# Altium footprint library THU VIEN PCB.PCBLib: 911 footprints (part 31 of 57)
Each footprint in its own frame and in the unit in brackets; x right, y up, seen from the top. Pads: shape width x height; smd on the part's side, far side on the other; paste and mask are expansions set on the pad; w line width, h text height; cw(c..) or ccw(c..) is an arc to the next point about the centre after c.
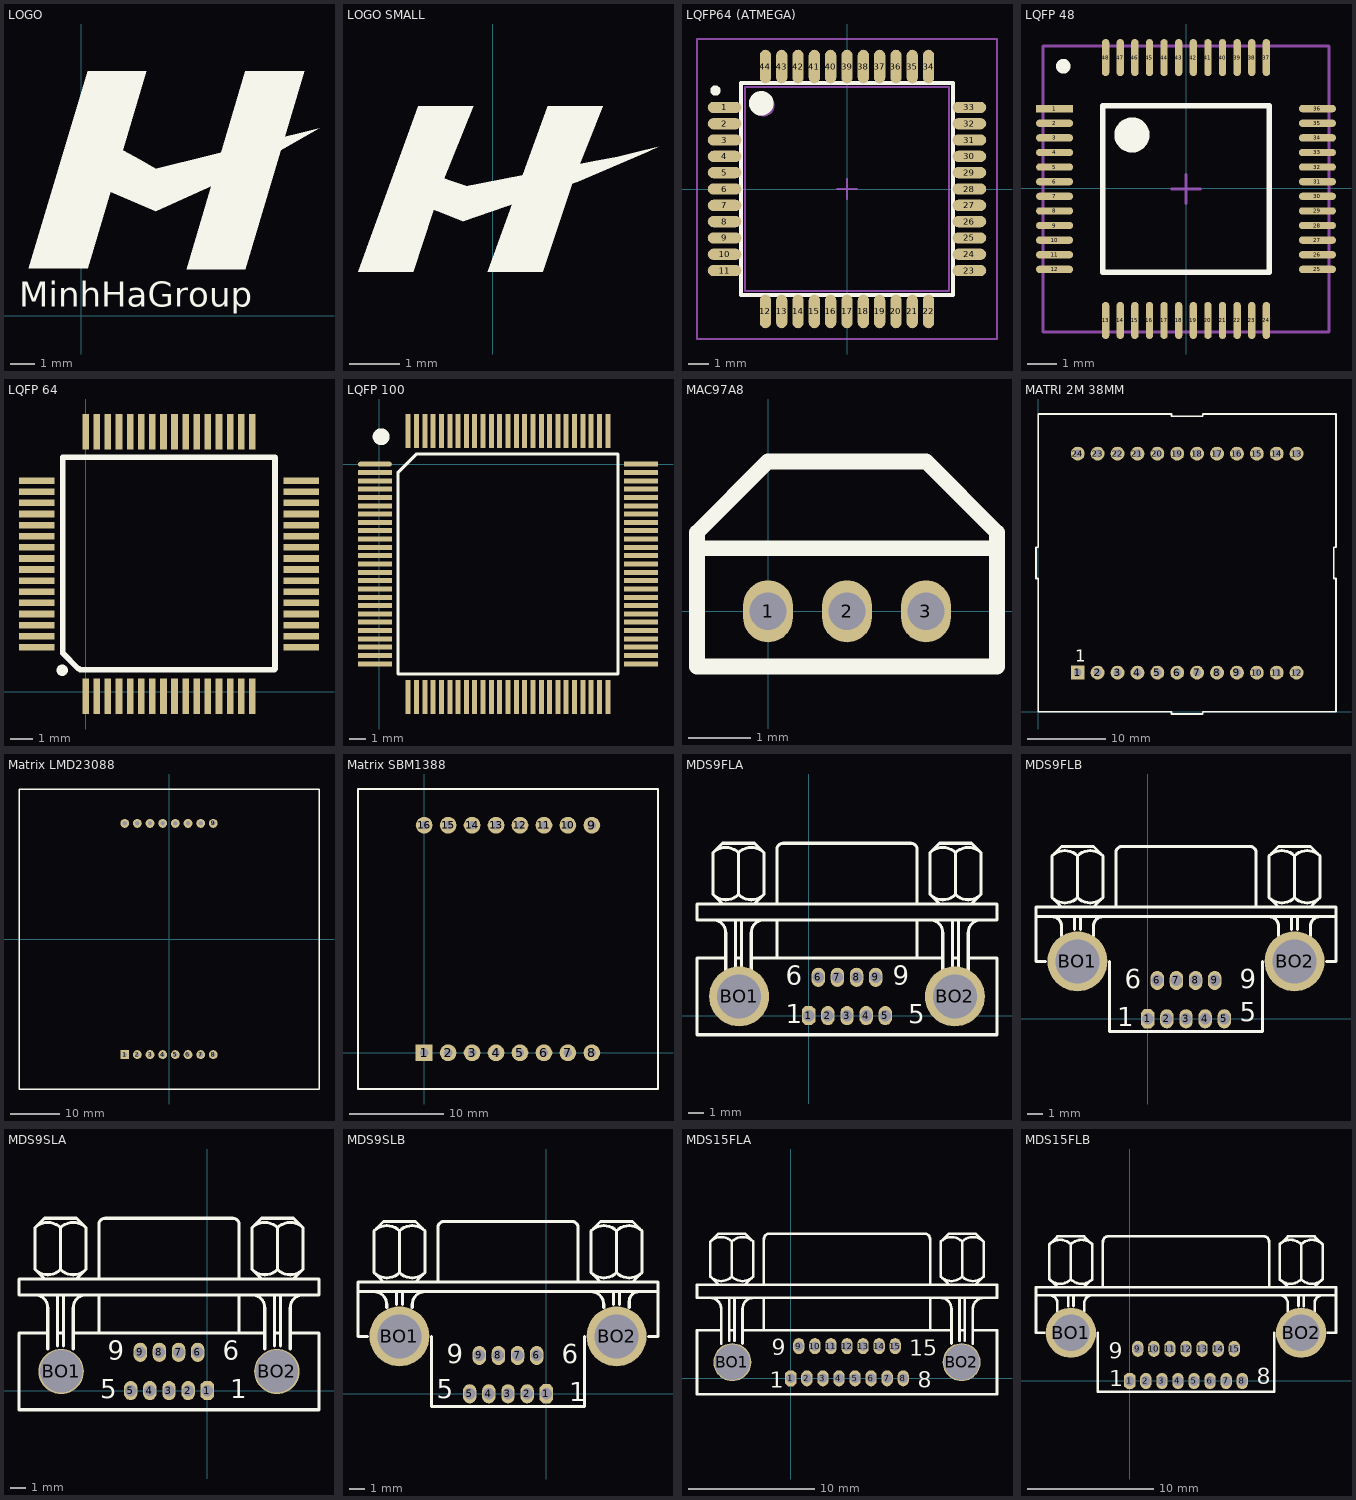
[diagram p30: the footprints below, top view; thin cyan lines are the x and y axes]

## LOGO [mil]
Top Overlay:
  region: 120,169.25 213,211.25 271,238.25 384,303 120,238
  region: 67,268 95,252 120,238 120,169 41,203 57,237
  region: 360,395 265,395 265,75
  region: 170,75 265,75 265,395
  region: -85,77 10,77 10,395
  region: 105,395 10,395 10,77
  text "MinhHaGroup" at -101,15 h40

## LOGO SMALL [mil]
Top Overlay:
  region: -3.94,102.36 39.37,102.36 43.31,232.28
  region: 86.61,232.28 43.31,232.28 39.37,102.36 62.99,173.23
  region: -15.75,232.28 -59.06,232.28 -62.99,102.36 -39.37,173.23
  region: -106.3,102.36 -62.99,102.36 -59.06,232.28
  region: -66.85,197.03 -59.31,184.17 -43.31,177.17 -13.76,167.3 -19.68,145.67 -23.62,141.73 -43.31,149.61 -78.74,161.42 -76.76,166.3
  region: -23.62,141.73 66.93,173.23 122.05,196.85 129.92,200.79 114.17,196.85 98.43,192.91 78.74,188.98 59.06,185.04 39.37,181.1 -23.62,169.29

## LQFP64 (ATMEGA) [mm] "QFP, 44-Leads, Body 10x10mm, Pitch 0.8mm, IPC High Density"
height 2.44
pads (44):
  oval 1.65x0.55 smd: 1(-6,4) 2(-6,3.2) 3(-6,2.4) 4(-6,1.6) 5(-6,0.8) 6(-6,0) 7(-6,-0.8) 8(-6,-1.6) 9(-6,-2.4) 10(-6,-3.2) 11(-6,-4) 23(6,-4) 24(6,-3.2) 25(6,-2.4) 26(6,-1.6) 27(6,-0.8) 28(6,0) 29(6,0.8) 30(6,1.6) 31(6,2.4) 32(6,3.2) 33(6,4)
  oval 0.55x1.65 smd: 12(-4,-6) 13(-3.2,-6) 14(-2.4,-6) 15(-1.6,-6) 16(-0.8,-6) 17(0,-6) 18(0.8,-6) 19(1.6,-6) 20(2.4,-6) 21(3.2,-6) 22(4,-6) 34(4,6) 35(3.2,6) 36(2.4,6) 37(1.6,6) 38(0.8,6) 39(0,6) 40(-0.8,6) 41(-1.6,6) 42(-2.4,6) 43(-3.2,6) 44(-4,6)
Top Overlay:
  circle w0.6: c-4.2,4.2 r0.3
  circle w0.25: c-6.45,4.825 r0.125
  lines w0.2: -5.2,-5.2 5.2,-5.2 5.2,5.2 -5.2,5.2 -5.2,-5.2
Mechanical 13:
  circle w0.1: c-4.1,4.1 r0.5
  lines w0.1: -5,-5 5,-5 5,5 -5,5 -5,-5
Mechanical 15:
  lines w0.1: -0.5,0 0.5,0 ; 0,-0.5 0,0.5 ; -7.35,-7.35 7.35,-7.35 7.35,7.35 -7.35,7.35 -7.35,-7.35
3D body "User Library-TQFP44.step": height 1.07, standoff 0, extent -5.994,-5.994 6.006,6.006

## LQFP 48 [mm]
pads (48):
  rect 1.27x0.25 smd: 1(-4.498,2.725)
  oval 1.27x0.25 smd: 2(-4.498,2.225) 3(-4.498,1.725) 4(-4.498,1.225) 5(-4.498,0.725) 6(-4.498,0.225) 7(-4.498,-0.275) 8(-4.498,-0.775) 9(-4.498,-1.275) 10(-4.498,-1.775) 11(-4.498,-2.275) 12(-4.498,-2.775) 25(4.498,-2.775) 26(4.498,-2.275) 27(4.498,-1.775) 28(4.498,-1.275) 29(4.498,-0.775) 30(4.498,-0.275) 31(4.498,0.225) 32(4.498,0.725) 33(4.498,1.225) 34(4.498,1.725) 35(4.498,2.225) 36(4.498,2.725)
  oval 0.25x1.27 smd: 13(-2.75,-4.524) 14(-2.25,-4.524) 15(-1.75,-4.524) 16(-1.25,-4.524) 17(-0.75,-4.524) 18(-0.25,-4.524) 19(0.25,-4.524) 20(0.75,-4.524) 21(1.25,-4.524) 22(1.75,-4.524) 23(2.25,-4.524) 24(2.75,-4.524) 37(2.75,4.473) 38(2.25,4.473) 39(1.75,4.473) 40(1.25,4.473) 41(0.75,4.473) 42(0.25,4.473) 43(-0.25,4.473) 44(-0.75,4.473) 45(-1.25,4.473) 46(-1.75,4.473) 47(-2.25,4.473) 48(-2.75,4.473)
Top Overlay:
  circle w0.25: c-4.2,4.175 r0.125
  circle w0.6: c-1.85,1.825 r0.3
  lines w0.2: -2.85,-2.875 -2.85,2.825 2.85,2.825 2.85,-2.875 -2.85,-2.875
Mechanical 15:
  lines w0.1: -0.5,-0.025 0.5,-0.025 ; 0,-0.525 0,0.475 ; -4.9,-4.925 -4.9,4.875 4.9,4.875 4.9,-4.925 -4.9,-4.925
3D body "SW3dPS-LQFP48.STEP": height 1.5, standoff 0, extent -4.5,-4.525 4.5,4.475

## LQFP 64 [mm]
pads (64):
  rect 0.3x1.6 smd: 1(0,-0.2) 2(0.5,-0.2) 3(1,-0.2) 4(1.5,-0.2) 5(2,-0.2) 6(2.5,-0.2) 7(3,-0.2) 8(3.5,-0.2) 9(4,-0.2) 10(4.5,-0.2) 11(5,-0.2) 12(5.5,-0.2) 13(6,-0.2) 14(6.5,-0.2) 15(7,-0.2) 16(7.5,-0.2) 33(7.5,11.7) 34(7,11.7) 35(6.5,11.7) 36(6,11.7) 37(5.5,11.7) 38(5,11.7) 39(4.5,11.7) 40(4,11.7) 41(3.5,11.7) 42(3,11.7) 43(2.5,11.7) 44(2,11.7) 45(1.5,11.7) 46(1,11.7) 47(0.5,11.7) 48(0,11.7)
  rect 1.6x0.3 smd: 17(9.7,2) 18(9.7,2.5) 19(9.7,3) 20(9.7,3.5) 21(9.7,4) 22(9.7,4.5) 23(9.7,5) 24(9.7,5.5) 25(9.7,6) 26(9.7,6.5) 27(9.7,7) 28(9.7,7.5) 29(9.7,8) 30(9.7,8.5) 31(9.7,9) 32(9.7,9.5) 49(-2.2,9.5) 50(-2.2,9) 51(-2.2,8.5) 52(-2.2,8) 53(-2.2,7.5) 54(-2.2,7) 55(-2.2,6.5) 56(-2.2,6) 57(-2.2,5.5) 58(-2.2,5) 59(-2.2,4.5) 60(-2.2,4) 61(-2.2,3.5) 62(-2.2,3) 63(-2.2,2.5) 64(-2.2,2)
Top Overlay:
  lines w0.254: -1.029,10.389 -1.029,10.554 8.42,10.554 8.509,10.554 8.522,10.541 8.522,1.029 8.484,0.991 -0.241,0.991 ; -1.029,10.528 -1.029,1.74 -0.318,1.029 -0.292,1.029
  lines w0.508: -1.067,0.965 -1.054,0.965
3D body "User Library-LQFP64_Grid_0_5.STEP": height 2.32, standoff -0.01, extent -2.352,-0.234 9.723,11.766

## LQFP 100 [mm]
pads (100):
  oval 2.032x0.3 smd: 1(-0.25,0)
  rect 2.032x0.3 smd: 2(-0.25,-0.5) 3(-0.25,-1) 4(-0.25,-1.5) 5(-0.25,-2) 6(-0.25,-2.5) 7(-0.25,-3) 8(-0.25,-3.5) 9(-0.25,-4) 10(-0.25,-4.5) 11(-0.25,-5) 12(-0.25,-5.5) 13(-0.25,-6) 14(-0.25,-6.5) 15(-0.25,-7) 16(-0.25,-7.5) 17(-0.25,-8) 18(-0.25,-8.5) 19(-0.25,-9) 20(-0.25,-9.5) 21(-0.25,-10) 22(-0.25,-10.5) 23(-0.25,-11) 24(-0.25,-11.5) 25(-0.25,-12) 51(15.75,-12) 52(15.75,-11.5) 53(15.75,-11) 54(15.75,-10.5) 55(15.75,-10) 56(15.75,-9.5) 57(15.75,-9) 58(15.75,-8.5) 59(15.75,-8) 60(15.75,-7.5) 61(15.75,-7) 62(15.75,-6.5) 63(15.75,-6) 64(15.75,-5.5) 65(15.75,-5) 66(15.75,-4.5) 67(15.75,-4) 68(15.75,-3.5) 69(15.75,-3) 70(15.75,-2.5) 71(15.75,-2) 72(15.75,-1.5) 73(15.75,-1) 74(15.75,-0.5) 75(15.75,0)
  rect 0.3x2.032 smd: 26(1.75,-14) 27(2.25,-14) 28(2.75,-14) 29(3.25,-14) 30(3.75,-14) 31(4.25,-14) 32(4.75,-14) 33(5.25,-14) 34(5.75,-14) 35(6.25,-14) 36(6.75,-14) 37(7.25,-14) 38(7.75,-14) 39(8.25,-14) 40(8.75,-14) 41(9.25,-14) 42(9.75,-14) 43(10.25,-14) 44(10.75,-14) 45(11.25,-14) 46(11.75,-14) 47(12.25,-14) 48(12.75,-14) 49(13.25,-14) 50(13.75,-14) 76(13.75,2) 77(13.25,2) 78(12.75,2) 79(12.25,2) 80(11.75,2) 81(11.25,2) 82(10.75,2) 83(10.25,2) 84(9.75,2) 85(9.25,2) 86(8.75,2) 87(8.25,2) 88(7.75,2) 89(7.25,2) 90(6.75,2) 91(6.25,2) 92(5.75,2) 93(5.25,2) 94(4.75,2) 95(4.25,2) 96(3.75,2) 97(3.25,2) 98(2.75,2) 99(2.25,2) 100(1.75,2)
Top Overlay:
  circle w0.508: c0.127,1.651 r0.254
  lines w0.2: 1.135,-12.615 1.135,-0.52 2.27,0.615 14.365,0.615 14.365,-12.615 1.135,-12.615
3D body "SW3dPS-LQFP100.STEP": height 1.6, standoff 0, extent -0.228,-13.994 15.772,2.006

## MAC97A8 [mm]
pads (3):
  oval 0.8x1 hole 0.6: 1(0,0) 2(1.27,0) 3(2.54,0)
Top Overlay:
  lines w0.254: -1.143,1.016 3.683,1.016 ; -1.143,1.016 -1.143,1.27 0,2.413 2.54,2.413 3.683,1.27 3.683,1.016 ; -1.143,1.016 -1.143,-0.889 3.683,-0.889 3.683,1.016

## MATRI 2M 38MM [mil]
pads (24):
  rect 70x70 hole 39.37: 1(198.08,195.94)
  round 70 hole 39.37: 2(298.08,195.94) 3(398.08,195.94) 4(498.08,195.94) 5(598.08,195.94) 6(698.08,195.94) 7(798.08,195.94) 8(898.08,195.94) 9(998.08,195.94) 10(1098.08,195.94) 11(1198.08,195.94) 12(1298.08,195.94) 13(1298.08,1296.69) 14(1198.08,1296.69) 15(1098.08,1296.69) 16(998.08,1296.69) 17(898.08,1296.69) 18(798.08,1296.69) 19(698.08,1296.69) 20(598.08,1296.69) 21(498.08,1296.69) 22(398.08,1296.69) 23(298.08,1296.69) 24(198.08,1296.69)
Top Overlay:
  lines w7.87: 0,1492.13 0,1496.06 ; -11.81,669.29 -11.81,826.77 ; -11.81,669.29 0,669.29 ; -11.81,669.29 -11.81,826.77 ; -11.81,669.29 0,669.29 ; -11.81,826.77 0,826.77 ; -11.81,826.77 0,826.77 ; 0,669.29 0,0 669.29,0 ; 0,826.77 0,1496.06 ; 0,1496.06 669.29,1496.06 ; 669.29,-11.81 669.29,0 ; 669.29,-11.81 826.77,-11.81 ; 669.29,-11.81 669.29,0 ; 669.29,-11.81 826.77,-11.81 ; 669.29,1484.25 826.77,1484.25 ; 669.29,1484.25 669.29,1496.06 ; 669.29,1484.25 669.29,1496.06 ; 669.29,1484.25 826.77,1484.25 ; 826.77,-11.81 826.77,0 ; 826.77,-11.81 826.77,0 ; 826.77,0 1496.06,0 1496.06,669.29 ; 826.77,1484.25 826.77,1496.06 ; 826.77,1484.25 826.77,1496.06 ; 826.77,1496.06 1496.06,1496.06 1496.06,1492.13 1496.06,826.77 ; 1484.25,669.29 1496.06,669.29 ; 1484.25,669.29 1484.25,826.77 ; 1484.25,669.29 1484.25,826.77 ; 1484.25,669.29 1496.06,669.29 ; 1484.25,826.77 1496.06,826.77 ; 1484.25,826.77 1496.06,826.77
  text "1" at 185.04,251.97 h60

## Matrix LMD23088 [mil] "Matrix 8x8"
pads (16):
  rect 70x70 hole 35: 1(-350,-913.39)
  round 70 hole 35: 2(-250,-913.39) 3(-150,-913.39) 4(-50,-913.39) 5(50,-913.39) 6(150,-913.39) 7(250,-913.39) 8(350,-913.39) 9(350,913.39) 10(250,913.39) 11(150,913.39) 12(50,913.39) 13(-50,913.39) 14(-150,913.39) 15(-250,913.39) 16(-350,913.39)
Top Overlay:
  lines w10: -1185.04,-1185.04 1185.04,-1185.04 1185.04,1185.04 -1185.04,1185.04 -1185.04,-1185.04

## Matrix SBM1388 [mil] "Matrix 8x8"
pads (16):
  rect 70x70 hole 35: 1(-1.1,0)
  round 70 hole 35: 2(98.9,0) 3(198.9,0) 4(298.9,0) 5(398.9,0) 6(498.9,0) 7(598.9,0) 8(698.9,0) 9(698.9,950) 10(598.9,950) 11(498.9,950) 12(398.9,950) 13(298.9,950) 14(198.9,950) 15(98.9,950) 16(-1.1,950)
Top Overlay:
  lines w10: -277.08,-150.98 -277.08,1100.98 974.88,1100.98 974.88,-150.98 -277.08,-150.98

## MDS9FLA [mil]
pads (11):
  oct 35x50 hole 30: 1(0,0)
  oval 35x50 hole 30: 2(50,0) 3(100,0) 4(150,0) 5(200,0) 6(25,100) 7(75,100) 8(125,100) 9(175,100)
  round 156.67 hole 115: BO1(-181.67,50) BO2(381.67,50)
Top Overlay:
  lines w8: -250.25,316.41 ccw(c-216.67,350) -183.08,316.41 ; -250.25,425.25 cw(c-216.67,391.67) -183.08,425.25 ; -250,250 cw(c-250,216.67) -216.67,216.67 -216.67,108.33 ; -225,291.67 -250,316.67 -250,425 -225,450 -141.67,450 -116.67,425 -116.67,316.67 -141.67,291.67 ; -216.67,150 -291.67,150 -291.67,-50 491.67,-50 491.67,150 416.67,150 ; -191.67,116.67 -191.67,250 ; -191.67,150 -175,150 ; -183.59,316.41 ccw(c-150,350) -116.41,316.41 ; -183.59,425.25 cw(c-150,391.67) -116.41,425.25 ; -183.33,316.67 -183.33,425 ; -175,116.67 -175,250 ; -150,108.33 -150,216.67 cw(c-116.67,216.67) -116.67,250 ; -150,150 350,150 ; -83.33,150 -83.33,250 ; -83.33,291.67 -83.33,433.33 cw(c-66.67,433.33) -66.67,450 266.67,450 cw(c266.67,433.33) 283.33,433.33 283.33,291.67 275,291.67 ; 283.33,150 283.33,250 ; 316.41,316.41 ccw(c350,350) 383.59,316.41 ; 316.41,425.25 cw(c350,391.67) 383.59,425.25 ; 316.67,250 cw(c316.67,216.67) 350,216.67 350,108.33 ; 341.67,291.67 316.67,316.67 316.67,425 341.67,450 425,450 450,425 450,316.67 425,291.67 ; 375,116.67 375,250 ; 375,150 391.67,150 ; 383.08,316.41 ccw(c416.67,350) 450.25,316.41 ; 383.08,425.25 cw(c416.67,391.67) 450.25,425.25 ; 383.33,316.67 383.33,425 ; 391.67,116.67 391.67,250 ; 416.67,108.33 416.67,216.67 cw(c450,216.67) 450,250 ; -291.67,250 -291.67,291.67 491.67,291.67 491.67,250 -291.67,250
  text "6" at -60,80 h50
  text "5" at 260,-20 h50
  text "9" at 220,80 h50
  text "1" at -60,-20 h50

## MDS9FLB [mil]
pads (11):
  oct 35x50 hole 30: 1(0,0)
  oval 35x50 hole 30: 2(50,0) 3(100,0) 4(150,0) 5(200,0) 6(25,100) 7(75,100) 8(125,100) 9(175,100)
  round 156.67 hole 115: BO1(-183.33,150) BO2(383.33,150)
Top Overlay:
  lines w8: -266.67,150 -291.67,150 -291.67,266.67 ; -250.25,316.41 ccw(c-216.67,350) -183.08,316.41 ; -250.25,425.25 cw(c-216.67,391.67) -183.08,425.25 ; -250,266.67 cw(c-250,241.67) -225,241.67 -225,216.67 ; -225,291.67 -250,316.67 -250,425 -225,450 -141.67,450 -116.67,425 -116.67,316.67 -141.67,291.67 ; -191.67,233.33 -191.67,266.67 ; -183.59,316.41 ccw(c-150,350) -116.41,316.41 ; -183.59,425.25 cw(c-150,391.67) -116.41,425.25 ; -183.33,316.67 -183.33,425 ; -175,233.33 -175,266.67 ; -141.67,216.67 -141.67,241.67 cw(c-116.67,241.67) -116.67,266.67 ; -100,150 -100,-33.33 300,-33.33 300,150 ; -83.33,291.67 -83.33,433.33 cw(c-66.67,433.33) -66.67,450 266.67,450 cw(c266.67,433.33) 283.33,433.33 283.33,291.67 275,291.67 ; 316.41,316.41 ccw(c350,350) 383.59,316.41 ; 316.41,425.25 cw(c350,391.67) 383.59,425.25 ; 316.67,266.67 cw(c316.67,241.67) 341.67,241.67 341.67,216.67 ; 341.67,291.67 316.67,316.67 316.67,425 341.67,450 425,450 450,425 450,316.67 425,291.67 ; 375,233.33 375,266.67 ; 383.08,316.41 ccw(c416.67,350) 450.25,316.41 ; 383.08,425.25 cw(c416.67,391.67) 450.25,425.25 ; 383.33,316.67 383.33,425 ; 391.67,233.33 391.67,266.67 ; 425,216.67 425,241.67 cw(c450,241.67) 450,266.67 ; 466.67,150 491.67,150 491.67,266.67 ; -291.67,266.67 -291.67,291.67 491.67,291.67 491.67,266.67 ; -291.67,266.67 491.67,266.67
  text "9" at 240,80 h50
  text "6" at -60,80 h50
  text "1" at -80,-20 h50
  text "5" at 240.94,-6.59 h50

## MDS9SLA [mil]
pads (11):
  oct 35x50 hole 30: 1(0,0)
  oval 35x50 hole 30: 2(-50,0) 3(-100,0) 4(-150,0) 5(-200,0) 6(-25,100) 7(-75,100) 8(-125,100) 9(-175,100)
  round 118.33 hole 110.83: BO1(-381.67,50) BO2(181.67,50)
Top Overlay:
  lines w8: -450.25,316.41 ccw(c-416.67,350) -383.08,316.41 ; -450.25,425.25 cw(c-416.67,391.67) -383.08,425.25 ; -450,250 cw(c-450,216.67) -416.67,216.67 -416.67,108.33 ; -425,291.67 -450,316.67 -450,425 -425,450 -341.67,450 -316.67,425 -316.67,316.67 -341.67,291.67 ; -416.67,150 -491.67,150 -491.67,-50 291.67,-50 291.67,150 216.67,150 ; -391.67,116.67 -391.67,250 ; -391.67,150 -375,150 ; -383.59,316.41 ccw(c-350,350) -316.41,316.41 ; -383.59,425.25 cw(c-350,391.67) -316.41,425.25 ; -383.33,316.67 -383.33,425 ; -375,116.67 -375,250 ; -350,108.33 -350,216.67 cw(c-316.67,216.67) -316.67,250 ; -350,150 150,150 ; -283.33,150 -283.33,250 ; -283.33,291.67 -283.33,433.33 cw(c-266.67,433.33) -266.67,450 66.67,450 cw(c66.67,433.33) 83.33,433.33 83.33,291.67 75,291.67 ; 83.33,150 83.33,250 ; 116.41,316.41 ccw(c150,350) 183.59,316.41 ; 116.41,425.25 cw(c150,391.67) 183.59,425.25 ; 116.67,250 cw(c116.67,216.67) 150,216.67 150,108.33 ; 141.67,291.67 116.67,316.67 116.67,425 141.67,450 225,450 250,425 250,316.67 225,291.67 ; 175,116.67 175,250 ; 175,150 191.67,150 ; 183.08,316.41 ccw(c216.67,350) 250.25,316.41 ; 183.08,425.25 cw(c216.67,391.67) 250.25,425.25 ; 183.33,316.67 183.33,425 ; 191.67,116.67 191.67,250 ; 216.67,108.33 216.67,216.67 cw(c250,216.67) 250,250 ; -491.67,250 291.67,250 291.67,291.67 -491.67,291.67 -491.67,250
  text "6" at 40,80 h50
  text "9" at -260,80 h50
  text "5" at -280,-20 h50
  text "1" at 60,-20 h50

## MDS9SLB [mil]
pads (11):
  oct 35x50 hole 30: 1(0,0)
  oval 35x50 hole 30: 2(-50,0) 3(-100,0) 4(-150,0) 5(-200,0) 6(-25,100) 7(-75,100) 8(-125,100) 9(-175,100)
  round 156.67 hole 115: BO1(-383.33,150) BO2(183.33,150)
Top Overlay:
  lines w8: -466.67,150 -491.67,150 -491.67,266.67 ; -450.25,316.41 ccw(c-416.67,350) -383.08,316.41 ; -450.25,425.25 cw(c-416.67,391.67) -383.08,425.25 ; -450,266.67 cw(c-450,233.33) -416.67,233.33 -416.67,225 ; -425,291.67 -450,316.67 -450,425 -425,450 -341.67,450 -316.67,425 -316.67,316.67 -341.67,291.67 ; -391.67,233.33 -391.67,266.67 ; -383.59,316.41 ccw(c-350,350) -316.41,316.41 ; -383.59,425.25 cw(c-350,391.67) -316.41,425.25 ; -383.33,316.67 -383.33,425 ; -375,233.33 -375,266.67 ; -350,225 -350,233.33 cw(c-316.67,233.33) -316.67,266.67 ; -300,150 -300,-33.33 100,-33.33 100,150 ; -283.33,291.67 -283.33,433.33 cw(c-266.67,433.33) -266.67,450 66.67,450 cw(c66.67,433.33) 83.33,433.33 83.33,291.67 75,291.67 ; 116.41,316.41 ccw(c150,350) 183.59,316.41 ; 116.41,425.25 cw(c150,391.67) 183.59,425.25 ; 116.67,266.67 cw(c116.67,233.33) 150,233.33 150,225 ; 141.67,291.67 116.67,316.67 116.67,425 141.67,450 225,450 250,425 250,316.67 225,291.67 ; 175,233.33 175,266.67 ; 183.08,316.41 ccw(c216.67,350) 250.25,316.41 ; 183.08,425.25 cw(c216.67,391.67) 250.25,425.25 ; 183.33,316.67 183.33,425 ; 191.67,233.33 191.67,266.67 ; 216.67,225 216.67,241.67 cw(c241.67,241.67) 241.67,266.67 ; 266.67,150 291.67,150 291.67,266.67 ; -491.67,266.67 291.67,266.67 ; -491.67,266.67 -491.67,291.67 291.67,291.67 291.67,266.67
  text "6" at 40,80 h50
  text "9" at -260,80 h50
  text "1" at 60,-20 h50
  text "5" at -286.05,-11.4 h50

## MDS15FLA [mil]
pads (17):
  oct 35x50 hole 30: 1(0,0)
  oval 35x50 hole 30: 2(50,0) 3(100,0) 4(150,0) 5(200,0) 6(250,0) 7(300,0) 8(350,0) 9(25,100) 10(75,100) 11(125,100) 12(175,100) 13(225,100) 14(275,100) 15(325,100)
  round 118.33 hole 110.83: BO1(-181.67,50) BO2(531.67,50)
Top Overlay:
  lines w8: -250.25,316.41 ccw(c-216.67,350) -183.08,316.41 ; -250.25,425.25 cw(c-216.67,391.67) -183.08,425.25 ; -250,250 cw(c-250,216.67) -216.67,216.67 -216.67,108.33 ; -225,291.67 -250,316.67 -250,425 -225,450 -141.67,450 -116.67,425 -116.67,316.67 -141.67,291.67 ; -216.67,150 -291.67,150 -291.67,-50 641.67,-50 641.67,150 566.67,150 ; -191.67,116.67 -191.67,250 ; -191.67,150 -175,150 ; -183.59,316.41 ccw(c-150,350) -116.41,316.41 ; -183.59,425.25 cw(c-150,391.67) -116.41,425.25 ; -183.33,316.67 -183.33,425 ; -175,116.67 -175,250 ; -150,108.33 -150,216.67 cw(c-116.67,216.67) -116.67,250 ; -150,150 500,150 ; -83.33,150 -83.33,250 ; -83.33,291.67 -83.33,433.33 cw(c-66.67,433.33) -66.67,450 416.67,450 cw(c416.67,433.33) 433.33,433.33 433.33,291.67 425,291.67 ; 433.33,150 433.33,250 ; 466.41,316.41 ccw(c500,350) 533.59,316.41 ; 466.41,425.25 cw(c500,391.67) 533.59,425.25 ; 466.67,250 cw(c466.67,216.67) 500,216.67 500,108.33 ; 491.67,291.67 466.67,316.67 466.67,425 491.67,450 575,450 600,425 600,316.67 575,291.67 ; 525,116.67 525,250 ; 525,150 541.67,150 ; 533.08,316.41 ccw(c566.67,350) 600.25,316.41 ; 533.08,425.25 cw(c566.67,391.67) 600.25,425.25 ; 533.33,316.67 533.33,425 ; 541.67,116.67 541.67,250 ; 566.67,108.33 566.67,216.67 cw(c600,216.67) 600,250 ; -291.67,250 -291.67,291.67 641.67,291.67 641.67,250 -291.67,250
  text "9" at -58.7,72 h50
  text "1" at -65,-30 h50
  text "8" at 395,-30 h50
  text "15" at 368.7,69.7 h50

## MDS15FLB [mil]
pads (17):
  oct 35x50 hole 30: 1(0,0)
  oval 35x50 hole 30: 2(50,0) 3(100,0) 4(150,0) 5(200,0) 6(250,0) 7(300,0) 8(350,0) 9(25,100) 10(75,100) 11(125,100) 12(175,100) 13(225,100) 14(275,100) 15(325,100)
  round 156.67 hole 115: BO1(-183.33,150) BO2(533.33,150)
Top Overlay:
  lines w8: -266.67,150 -291.67,150 -291.67,266.67 ; -250.25,316.41 ccw(c-216.67,350) -183.08,316.41 ; -250.25,425.25 cw(c-216.67,391.67) -183.08,425.25 ; -250,266.67 cw(c-250,241.67) -225,241.67 -225,216.67 ; -225,291.67 -250,316.67 -250,425 -225,450 -141.67,450 -116.67,425 -116.67,316.67 -141.67,291.67 ; -191.67,233.33 -191.67,266.67 ; -183.59,316.41 ccw(c-150,350) -116.41,316.41 ; -183.59,425.25 cw(c-150,391.67) -116.41,425.25 ; -183.33,316.67 -183.33,425 ; -175,233.33 -175,266.67 ; -141.67,216.67 -141.67,241.67 cw(c-116.67,241.67) -116.67,266.67 ; -100,150 -100,-33.33 450,-33.33 450,150 ; -83.33,291.67 -83.33,433.33 cw(c-66.67,433.33) -66.67,450 416.67,450 cw(c416.67,433.33) 433.33,433.33 433.33,291.67 425,291.67 ; 466.41,316.41 ccw(c500,350) 533.59,316.41 ; 466.41,425.25 cw(c500,391.67) 533.59,425.25 ; 466.67,266.67 cw(c466.67,241.67) 491.67,241.67 491.67,216.67 ; 491.67,291.67 466.67,316.67 466.67,425 491.67,450 575,450 600,425 600,316.67 575,291.67 ; 525,233.33 525,266.67 ; 533.08,316.41 ccw(c566.67,350) 600.25,316.41 ; 533.08,425.25 cw(c566.67,391.67) 600.25,425.25 ; 533.33,316.67 533.33,425 ; 541.67,233.33 541.67,266.67 ; 575,216.67 575,241.67 cw(c600,241.67) 600,266.67 ; 616.67,150 641.67,150 641.67,266.67 ; -291.67,266.67 641.67,266.67 ; -291.67,266.67 -291.67,291.67 641.67,291.67 641.67,266.67
  text "8" at 395,-10 h50
  text "1" at -63.5,-16.8 h50
  text "9" at -64.7,69.7 h50